# Altium footprint library connectors_terminal.PcbLib: 42 footprints (part 3 of 3)
Each footprint in its own frame and in the unit in brackets; x right, y up, seen from the top. Pads: shape width x height; smd on the part's side, far side on the other; paste and mask are expansions set on the pad; w line width, h text height; cw(c..) or ccw(c..) is an arc to the next point about the centre after c.
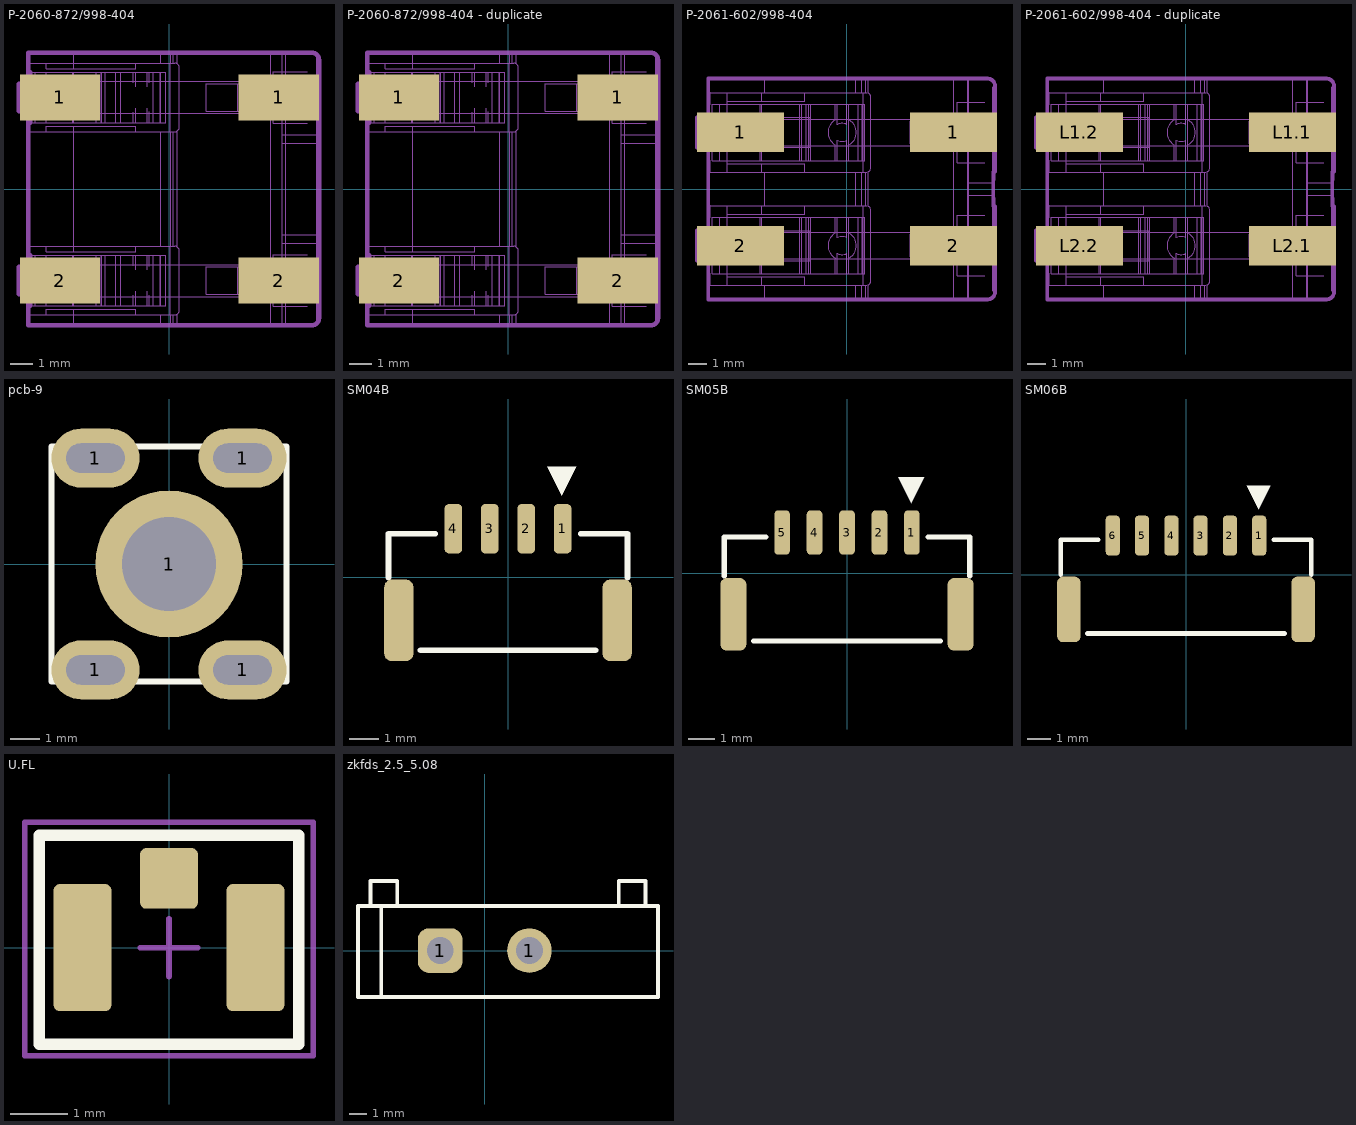
[diagram p2: the footprints below, top view; thin cyan lines are the x and y axes]

## P-2060-872/998-404 [mm]
pads (4):
  rect 3.5x2 smd: 1(-4.775,4) 1(4.775,4) 2(-4.775,-4) 2(4.775,-4)
M8_courtyard_bot:
  drawing of 199 lines, arcs and shapes, not listed
Mechanical 22:
  lines w0.2: -6.165,-5.95 6.21,-5.95 ; -6.165,5.95 6.21,5.95
3D body "2060-872_998-404.stp": height 5.5, standoff 0, extent -6.5,-5.95 6.6,5.95

## P-2060-872/998-404 - duplicate [mm]
pads (4):
  rect 3.5x2 smd: 1(-4.775,4) 1(4.775,4) 2(-4.775,-4) 2(4.775,-4)
M8_courtyard_bot:
  drawing of 199 lines, arcs and shapes, not listed
Mechanical 22:
  lines w0.2: -6.165,-5.95 6.21,-5.95 ; -6.165,5.95 6.21,5.95
3D body "2060-452_998-404.stp": height 5.5, standoff 0, extent -5.975,-3.95 7.125,3.95

## P-2061-602/998-404 [mm]
pads (4):
  rect 4.6x2.1 smd: 1(-5.65,3) 1(5.64,3) 2(-5.65,-3) 2(5.64,-3)
M8_courtyard_bot:
  drawing of 345 lines, arcs and shapes, not listed
Mechanical 22:
  lines w0.2: -7.35,-5.85 7.446,-5.85 ; -7.35,5.85 7.446,5.85
3D body: height 0.25, standoff 0, extent 0,0 0,0
3D body "2061-602_998-404.stp": height 6.74, standoff -0.01, extent -7.9,-5.85 7.9,5.85

## P-2061-602/998-404 - duplicate [mm]
pads (4):
  rect 4.6x2.1 smd: L1.1(5.64,3) L1.2(-5.65,3) L2.1(5.64,-3) L2.2(-5.65,-3)
M8_courtyard_bot:
  drawing of 345 lines, arcs and shapes, not listed
Mechanical 22:
  lines w0.2: -7.35,-5.85 7.446,-5.85 ; -7.35,5.85 7.446,5.85
3D body: height 0.25, standoff 0, extent 0,0 0,0
3D body "2060-452_998-404.stp": height 5.5, standoff 0, extent -5.975,-3.95 7.125,3.95

## pcb-9 [mm] "COMPATIBLE_796861-4_796863-4_796859-4"
height 0.025
pads (5):
  oval 3x2 hole 1 slot 2 at 0 deg: 1(-2.5,3.6) 1(-2.5,-3.6) 1(2.5,-3.6) 1(2.5,3.6)
  round 5 hole 3.2: 1(0,0)
Top Overlay:
  circle w0.2: c0,0 r1.5
  lines w0.2: -4,-4 4,-4 4,4 -4,4 -4,-4
3D body "2-36195-3.stp": height 7.75, standoff 4.3, extent -3.339,-3.744 9.539,3.8
3D body "M3x0_5xL Phillips Panhead Screw.step": height 7.48, standoff 1.1, extent -2.8,-2.8 2.8,2.8
3D body: height 4.2, standoff 3.4, extent -4,-4 4,4
3D body: height 4.2, standoff -2.6, extent -3.3,-4 -1.7,-3.2
3D body: height 4.2, standoff -2.6, extent 1.7,-4 3.3,-3.2
3D body: height 4.2, standoff -2.6, extent 1.7,3.2 3.3,4
3D body: height 4.2, standoff -2.6, extent -3.3,3.2 -1.7,4
3D body: height 4.2, standoff 0.1, extent -4,-4 4,-3.1
3D body: height 4.2, standoff 0.1, extent -4,3.1 4,4

## SM04B [mm] "SM04B-GHS-TB(LF)(SN)"
height 0.025
pads (6):
  rrect50% 0.6x1.7 smd: 1(1.875,1.675) 2(0.625,1.675) 3(-0.625,1.675) 4(-1.875,1.675)
  rrect50% 1x2.8 smd: ""(-3.75,-1.475) ""(3.75,-1.475)
Top Overlay:
  region: 1.35,3.8 2.35,3.8 1.85,2.8
  lines w0.2: -4.1,0 -4.1,1.5 -2.5,1.5 ; -3,-2.5 3,-2.5 ; 2.5,1.5 4.1,1.5 4.1,0
3D body "SM04B-GHS-TB.STEP": height 4.35, standoff 0, extent -4.125,-2.5 4.125,2.35

## SM05B [mm] "SM05B-GHS-TB(LF)(SN)"
height 0.025
pads (7):
  rrect50% 0.6x1.7 smd: 1(2.5,1.575) 2(1.25,1.575) 3(0,1.575) 4(-1.25,1.575) 5(-2.5,1.575)
  rrect50% 1x2.8 smd: ""(-4.375,-1.575) ""(4.375,-1.575)
Top Overlay:
  region: 1.975,3.7 2.975,3.7 2.475,2.7
  lines w0.2: -4.725,-0.1 -4.725,1.4 -3.125,1.4 ; -3.6,-2.6 3.6,-2.6 ; 3.125,1.4 4.725,1.4 4.725,-0.1
3D body "SM05B-GHS-TB.STEP": height 4.35, standoff 0, extent -4.75,-2.6 4.75,2.25

## SM06B [mm] "SM06B-GHS-TB(LF)(SN)"
height 0.025
pads (8):
  rrect50% 0.6x1.7 smd: 1(3.125,1.675) 2(1.875,1.675) 3(0.625,1.675) 4(-0.625,1.675) 5(-1.875,1.675) 6(-3.125,1.675)
  rrect50% 1x2.8 smd: ""(-5,-1.475) ""(5,-1.475)
Top Overlay:
  region: 2.6,3.8 3.6,3.8 3.1,2.8
  lines w0.2: -5.35,0 -5.35,1.5 -3.75,1.5 ; -4.2,-2.5 4.2,-2.5 ; 3.75,1.5 5.35,1.5 5.35,0
3D body "SM06B-GHS-TB.STEP": height 4.35, standoff 0, extent -5.375,-2.5 5.375,2.35

## U.FL [mm] "U.FL-R-SMT(10)"
height 0.025
pads (3):
  rrect20% 1x2.2 smd: ""(-1.5,0) ""(1.5,0)
  rrect20% 1x1.05 smd: ""(0,1.2)
Top Overlay:
  lines w0.2: -2.25,-1.675 2.25,-1.675 2.25,1.95 -2.25,1.95 -2.25,-1.675
M3_comm_top:
  text ".comment" at 0,0 h1
M5_asm_top:
  lines w0.1: -2.25,-1.675 2.25,-1.675 2.25,1.95 -2.25,1.95 -2.25,-1.675
  text ".Designator" at -1.3,2.275 h1
M7_courtyard_top:
  lines w0.1: -0.5,0 0.5,0 ; 0,-0.5 0,0.5 ; -2.5,-1.875 2.5,-1.875 2.5,2.175 -2.5,2.175 -2.5,-1.875
3D body "User Library-U_FL-R-SMT(10).STEP": height 1.25, standoff 0, extent -1.5,-1.55 1.5,1.55

## zkfds_2.5_5.08 [mm] "COMPATIBLE_796861-4_796863-4_796859-4"
height 0.025
pads (2):
  rrect50% 2.5x2.5 hole 1.5 mask+0.127: 1(-2.5,0)
  round 2.5 hole 1.5 mask+0.127: 1(2.5,0)
Top Overlay:
  lines w0.2: -7.1,-2.6 -7.1,2.5 ; -6.4,2.5 -6.4,3.9 -4.9,3.9 -4.9,2.5 ; -5.8,-2.6 -5.8,2.5 ; 7.5,2.5 7.5,3.9 9,3.9 9,2.5
  lines w0.203: -7.1,-2.6 9.7,-2.6 9.7,2.5 -7.1,2.5
3D body "ZFKDS 2,5-5,08.stp": height 14.22, standoff -3.48, extent -7.15,-2.55 9.7,3.93